# Altium footprint library rt10.PcbLib: 61 footprints (part 4 of 4)
Each footprint in its own frame and in the unit in brackets; x right, y up, seen from the top. Pads: shape width x height; smd on the part's side, far side on the other; paste and mask are expansions set on the pad; w line width, h text height; cw(c..) or ccw(c..) is an arc to the next point about the centre after c.
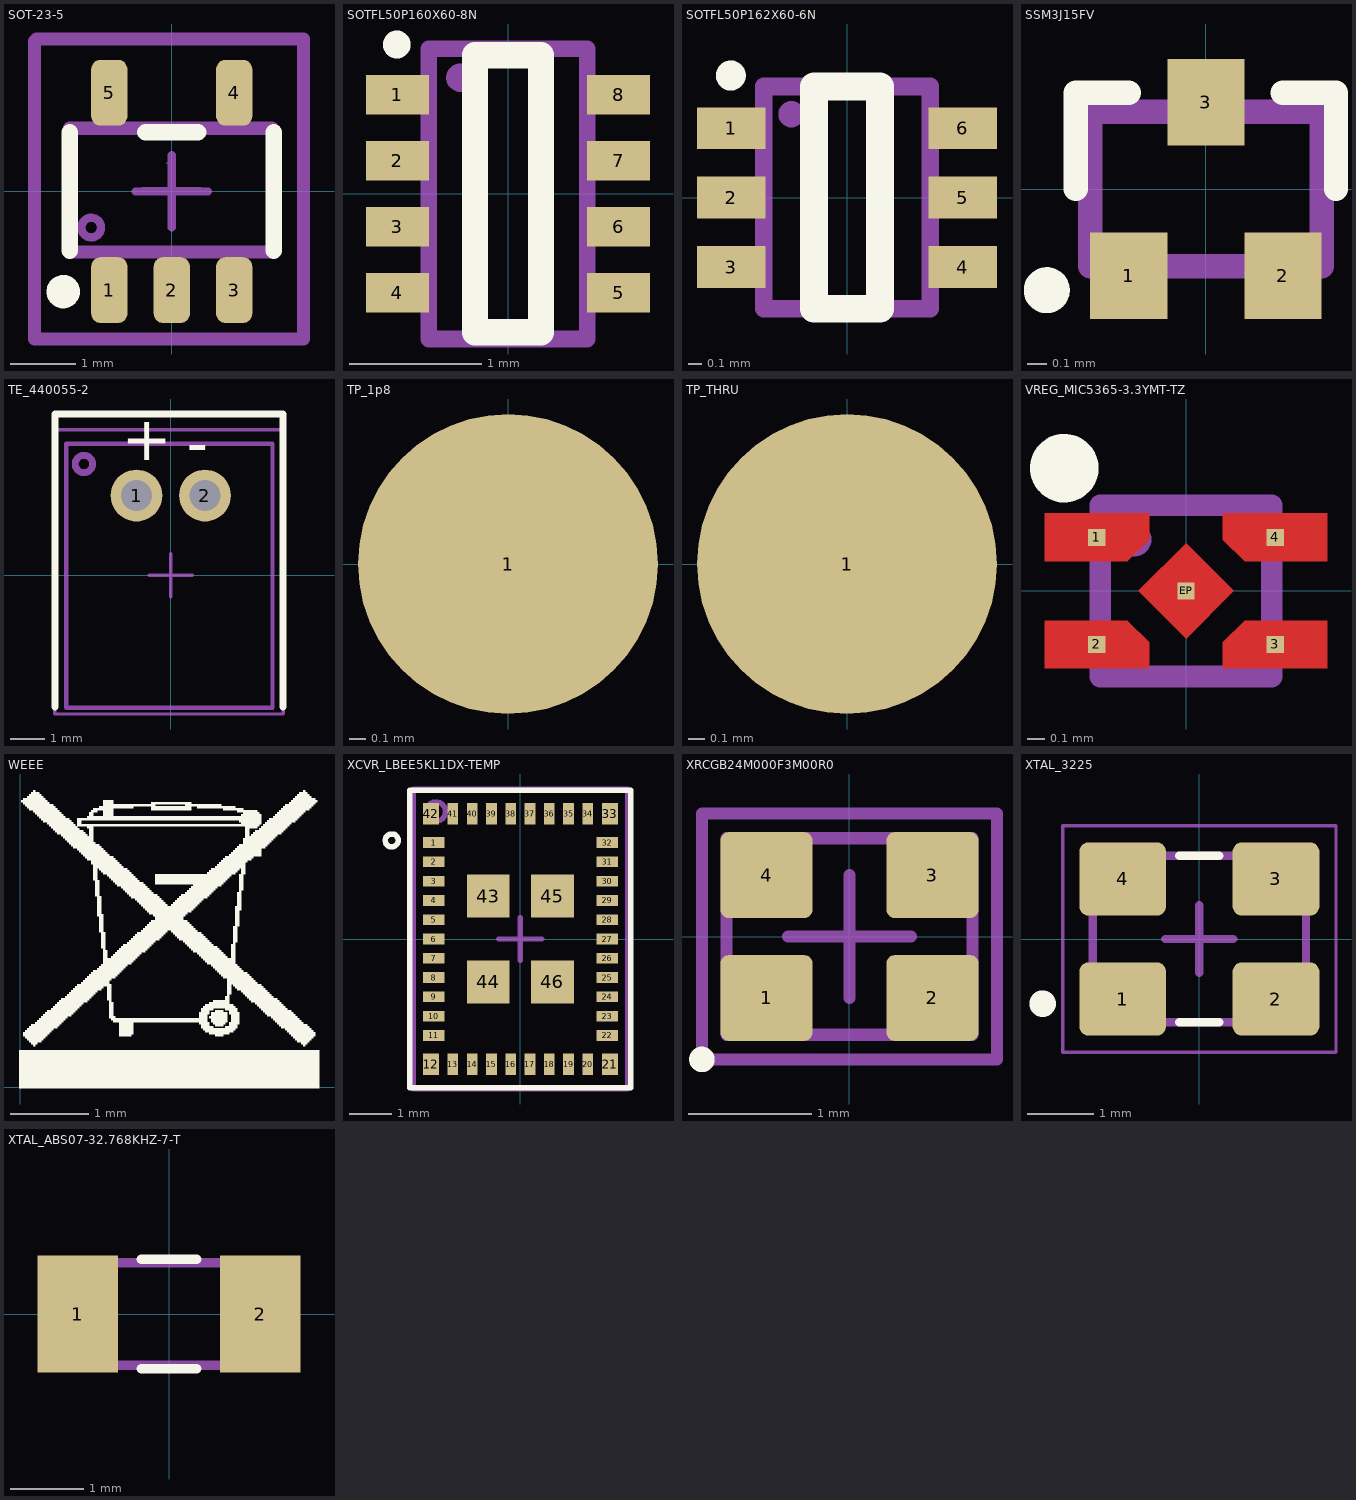
[diagram p3: the footprints below, top view; thin cyan lines are the x and y axes]

## SOT-23-5 [mm]
height 1.295
pads (5):
  rrect50% 0.55x1 smd: 1(-0.95,-1.5) 2(0,-1.5) 3(0.95,-1.5) 4(0.95,1.5) 5(-0.95,1.5)
Top Overlay:
  circle w0.254: c-1.651,-1.524 r0.127
  lines w0.254: -1.55,-0.9 -1.55,0.9 ; -0.4,0.9 0.4,0.9 ; 1.55,-0.9 1.55,0.9
Mechanical 13:
  circle w0.127: c-1.225,-0.55 r0.15
  lines w0.127: -0.432,0 0,0 ; 0,-0.432 0,0 ; 0,0.432 0,0 ; 0.432,0 0,0
  lines w0.2: -1.557,-0.931 -1.549,-0.923 1.557,-0.923 1.549,-0.916 1.549,0.936 1.524,0.961 -1.557,0.961 -1.557,-0.931
  text ".designator" at -1.295,0.229 h0.4
Mechanical 15:
  lines w0.003: -0.076,0.429 -0.025,0.48
  lines w0.125: -0.55,0 0,0 ; 0,-0.55 0,0 ; 0,0.55 0,0 ; 0.55,0 0,0
  lines w0.2: -2.085,2.285 -2.085,-2.244 2.001,-2.244 2.001,2.318 -2.052,2.318
3D body "SOT-23-5.stp": height 1.18, standoff 0.01, extent -1.507,-1.336 1.481,1.464

## SOTFL50P160X60-8N [mm] "SOTFL50P160X60-8N"
pads (8):
  rect 0.475x0.3 smd: 1(-0.838,0.75) 2(-0.838,0.25) 3(-0.838,-0.25) 4(-0.838,-0.75) 5(0.838,-0.75) 6(0.838,-0.25) 7(0.838,0.25) 8(0.838,0.75)
Top Overlay:
  circle w0.127: c-0.843,1.131 r0.042
  lines w0.2: -0.25,-1.05 -0.25,1.05 0.25,1.05 0.25,-1.05 -0.25,-1.05
Mechanical 13:
  circle w0.127: c-0.361,0.88 r0.044
  lines w0.127: -0.6,-1.1 0.6,-1.1 0.6,1.1 -0.6,1.1 -0.6,-1.1
  text ".designator" at 0.75,-1.1 h0.64
3D body: height 0.6, standoff 0, extent -0.6,-1.1 0.6,1.1

## SOTFL50P162X60-6N [mm] "SOTFL50P162X60-6N"
pads (6):
  rect 0.492x0.3 smd: 1(-0.834,0.5) 2(-0.834,0) 3(-0.834,-0.5) 4(0.834,-0.5) 5(0.834,0) 6(0.834,0.5)
Top Overlay:
  circle w0.127: c-0.837,0.879 r0.045
  lines w0.2: -0.238,-0.8 0.238,-0.8 0.238,0.8 -0.238,0.8 -0.238,-0.8
Mechanical 13:
  circle w0.127: c-0.4,0.6 r0.031
  lines w0.127: -0.6,-0.8 0.6,-0.8 0.6,0.8 -0.6,0.8 -0.6,-0.8
  text ".designator" at 0.761,-0.804 h0.64
3D body: height 0.6, standoff 0, extent -0.6,-0.8 0.6,0.8

## SSM3J15FV [mm]
pads (3):
  rect 0.4x0.45 smd: 1(-0.4,-0.45) 2(0.4,-0.45) 3(0,0.45)
Top Overlay:
  circle w0.127: c-0.825,-0.525 r0.056
  lines w0.127: -0.675,0 -0.675,0.5 -0.65,0.5 -0.4,0.5 ; 0.4,0.5 0.65,0.5 0.675,0.5 0.675,0
Mechanical 13:
  lines w0.127: -0.6,-0.4 -0.6,0.4 0.6,0.4 0.6,-0.4 -0.6,-0.4
  text ".designator" at -0.6,-0.635 h0.64
3D body: height 0.2, standoff 0, extent 0.3,-0.6 0.5,-0.3
3D body: height 0.2, standoff 0, extent -0.1,0.3 0.1,0.6
3D body: height 0.2, standoff 0, extent -0.5,-0.6 -0.3,-0.3
3D body: height 0.6, standoff 0, extent -0.6,-0.4 0.6,0.4

## TE_440055-2 [mm] "CONN HEADER PH SIDE 2POS 2MM TH"
height 5.5
pads (2):
  round 1.5 hole 0.9 mask+0.05: 1(-0.991,2.311) 2(0.991,2.311)
Top Overlay:
  lines w0.2: -3.353,-3.81 -3.353,4.674 3.251,4.674 3.251,-3.81
  text "+" at -1.422,3.327 h1.27
  text "-" at 0.457,3.226 h1.27
Top Paste:
  circle w0.508: c0.991,2.311 r0.733
  circle w0.508: c-0.991,2.311 r0.733
Mechanical 13:
  circle w0.2: c-2.515,3.226 r0.252
  lines w0.1: -0.625,0 0,0 ; 0,-0.625 0,0 ; 0,0.625 0,0 ; 0.625,0 0,0
  lines w0.127: -3.023,-3.835 2.946,-3.835 2.946,3.81 -3.023,3.81 -3.023,-3.835
  text ".designator" at -0.85,0.8 h0.4
Mechanical 15:
  lines w0.1: -0.625,0 0,0 ; 0,-0.625 0,0 ; 0,0.625 0,0 ; 0.625,0 0,0 ; -3.353,-4.013 3.251,-4.013 3.251,4.216 -3.353,4.216 -3.353,-4.013
3D body "c-440055-2-b3-3d.stp": height 4.96, standoff -3.39, extent -3.054,-3.875 2.946,3.825

## TP_1p8 [mm]
pads (1):
  round 1.8 smd paste-2: 1(0,0)

## TP_THRU [mil]
pads (1):
  round 74 smd: 1(0,0)

## VREG_MIC5365-3.3YMT-TZ [mil] "VREG_MIC5365-3.3YMT-TZ"
pads (5):
  rect 3.94x3.94 smd paste+0 mask+0: 1(-20.5,12.3) 2(-20.5,-12.3) 3(20.5,-12.3) 4(20.5,12.3) EP(0,0)
Top Layer:
  region: -32.5,17.8 -32.5,6.8 -13.5,6.8 -8.5,11.8 -8.5,17.8
  region: 32.5,17.8 32.5,6.8 13.5,6.8 8.5,11.8 8.5,17.8
  region: -32.5,-17.8 -32.5,-6.8 -13.5,-6.8 -8.5,-11.8 -8.5,-17.8
  region: 32.5,-17.8 32.5,-6.8 13.5,-6.8 8.5,-11.8 8.5,-17.8
  region: -11,0 0,-11 11,0 0,11
Top Overlay:
  circle w7.87: c-27.97,28.21 r3.94
Top Paste:
  region: -32.5,17.8 -32.5,6.8 -13.5,6.8 -8.5,11.8 -8.5,17.8
  region: 32.5,17.8 32.5,6.8 13.5,6.8 8.5,11.8 8.5,17.8
  region: -32.5,-17.8 -32.5,-6.8 -13.5,-6.8 -8.5,-11.8 -8.5,-17.8
  region: 32.5,-17.8 32.5,-6.8 13.5,-6.8 8.5,-11.8 8.5,-17.8
  region: -11,0 0,-11 11,0 0,11
Top Solder:
  region: -6.53,19.77 -6.53,10.74 -12.44,4.83 -34.47,4.83 -34.47,19.77
  region: 6.53,19.77 6.53,10.74 12.44,4.83 34.47,4.83 34.47,19.77
  region: 34.47,-19.77 6.53,-19.77 6.53,-10.74 12.44,-4.83 34.47,-4.83
  region: -34.47,-4.83 -34.47,-19.77 -6.53,-19.77 -6.53,-10.74 -12.44,-4.83
  region: -13.78,0 0,-13.78 13.78,0 0,13.78
Mechanical 13:
  circle w5: c-11.81,11.81 r1.36
  lines w5: -19.68,-19.68 -19.68,19.68 19.68,19.68 19.68,-19.68 -19.68,-19.68
  text ".designator" at 23.62,-29.54 h25
3D body: height 21.65, standoff 0, extent -19.68,-19.68 19.68,19.68

## WEEE [mm] "WEEE"
Top Overlay:
  drawing of 457 lines, arcs and shapes, not listed

## XCVR_LBEE5KL1DX-TEMP [mm] "XCVR_LBEE5KL1DX-TEMP"
pads (46):
  rect 0.5x0.25 smd: 1(-2.025,2.25) 2(-2.025,1.8) 3(-2.025,1.35) 4(-2.025,0.9) 5(-2.025,0.45) 6(-2.025,0) 7(-2.025,-0.45) 8(-2.025,-0.9) 9(-2.025,-1.35) 10(-2.025,-1.8) 11(-2.025,-2.25) 22(2.025,-2.25) 23(2.025,-1.8) 24(2.025,-1.35) 25(2.025,-0.9) 26(2.025,-0.45) 27(2.025,0) 28(2.025,0.45) 29(2.025,0.9) 30(2.025,1.35) 31(2.025,1.8) 32(2.025,2.25)
  rect 0.375x0.5 smd: 12(-2.088,-2.925) 21(2.088,-2.925) 33(2.088,2.925) 42(-2.088,2.925)
  rect 0.25x0.5 smd: 13(-1.575,-2.925) 14(-1.125,-2.925) 15(-0.675,-2.925) 16(-0.225,-2.925) 17(0.225,-2.925) 18(0.675,-2.925) 19(1.125,-2.925) 20(1.575,-2.925) 34(1.575,2.925) 35(1.125,2.925) 36(0.675,2.925) 37(0.225,2.925) 38(-0.225,2.925) 39(-0.675,2.925) 40(-1.125,2.925) 41(-1.575,2.925)
  rect 1x1 smd: 43(-0.75,1) 44(-0.75,-1) 45(0.75,1) 46(0.75,-1)
Top Overlay:
  circle w0.127: c-3,2.3 r0.15
  lines w0.127: -2.575,-3.475 -2.575,3.475 2.575,3.475 2.575,-3.475 -2.575,-3.475
Mechanical 13:
  circle w0.127: c-1.968,2.973 r0.224
  lines w0.127: -0.5,0 0,0 ; 0,-0.5 0,0 ; 0,0.5 0,0 ; 0.5,0 0,0 ; -2.5,-3.5 2.5,-3.5 2.5,3.5 -2.5,3.5 -2.5,-3.5
3D body: height 1.1, standoff 0, extent -2.5,-3.5 2.5,3.5

## XRCGB24M000F3M00R0 [mm] "XRCGB24M000F3M00R0"
pads (4):
  rrect20% 0.75x0.7 smd mask+0.05: 1(-0.675,-0.5) 2(0.675,-0.5) 3(0.675,0.5) 4(-0.675,0.5)
Top Overlay:
  circle w0.127: c-1.2,-1 r0.04
Mechanical 13:
  circle w0.1: c-0.6,-0.4 r0.1
  lines w0.1: -0.5,0 0,0 ; 0,-0.5 0,0 ; 0,0.5 0,0 ; 0.5,0 0,0 ; 0,0 0,0 ; -1,-0.8 1,-0.8 1,0.8 -1,0.8 -1,-0.8
  text ".designator" at -0.8,1 h0.4
Mechanical 15:
  circle w0.1: c-0.6,-0.4 r0.1
  lines w0.1: -0.5,0 0,0 ; 0,-0.5 0,0 ; 0,0.5 0,0 ; 0.5,0 0,0 ; 0,0 0,0 ; -1.2,-1 -1.2,1 1.2,1 1.2,-1 -1.2,-1
3D body: height 0.65, standoff 0, extent -1,-0.8 1,0.8

## XTAL_3225 [mm]
pads (4):
  rrect25% 1.3x1.1 smd: 1(-1.15,-0.9) 2(1.15,-0.9) 3(1.15,0.9) 4(-1.15,0.9)
Top Overlay:
  circle w0.2: c-2.35,-0.97 r0.1
  lines w0.127: -0.3,-1.25 0.3,-1.25 ; -0.3,1.25 0.3,1.25
Mechanical 13:
  circle w0.2: c-1.143,-0.889 r0.1
  lines w0.127: -0.508,0 0,0 ; 0,-0.508 0,0 ; 0,0.508 0,0 ; 0.508,0 0,0 ; 0,0 0,0 ; -1.6,-1.25 -1.6,1.25 1.6,1.25 1.6,-1.25 -1.6,-1.25
  text ".designator" at -1.15,0.35 h0.64
Mechanical 15:
  lines w0.05: -2.05,-1.7 -2.05,1.7 2.05,1.7 2.05,-1.7 -2.05,-1.7
3D body "step_temp.STEP": height 0.8, standoff 0, extent -1.6,-1.25 1.6,1.25

## XTAL_ABS07-32.768KHZ-7-T [mm] "XTAL_ABS07-32.768KHZ-7-T"
pads (2):
  rect 1.1x1.6 smd: 1(-1.25,0) 2(1.25,0)
Top Overlay:
  lines w0.127: -0.38,-0.75 0.38,-0.75 ; -0.38,0.75 0.38,0.75
Mechanical 13:
  lines w0.127: -1.6,-0.7 1.6,-0.7 1.6,0.7 -1.6,0.7 -1.6,-0.7
  text ".designator" at -1.4,-0.85 h0.64
3D body: height 1, standoff 0, extent -1.6,-0.7 1.6,0.7